# Altium footprint library CPU_STM.PcbLib: 216 footprints (part 8 of 15)
Each footprint in its own frame and in the unit in brackets; x right, y up, seen from the top. Pads: shape width x height; smd on the part's side, far side on the other; paste and mask are expansions set on the pad; w line width, h text height; cw(c..) or ccw(c..) is an arc to the next point about the centre after c.
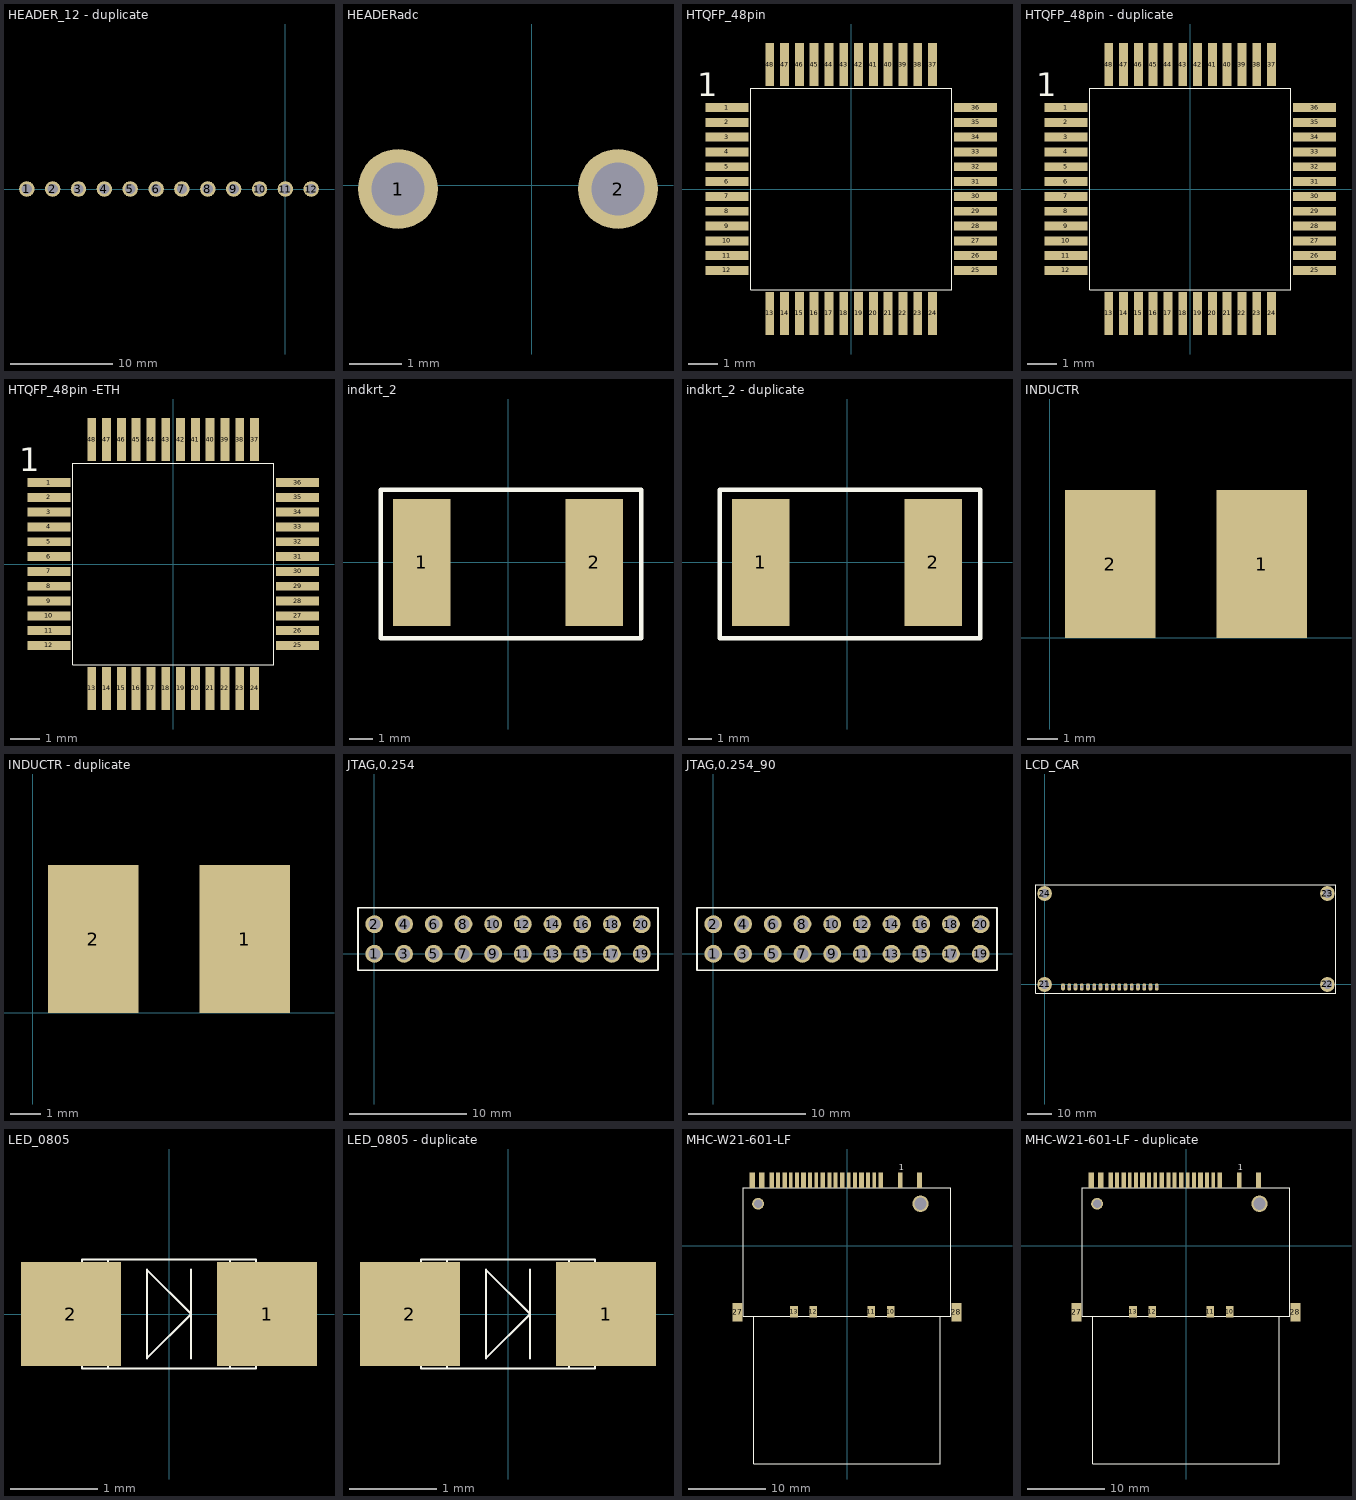
[diagram p7: the footprints below, top view; thin cyan lines are the x and y axes]

## HEADER_12 - duplicate [mil]
pads (12):
  round 60 hole 40: 1(-1000,0) 2(-900,0) 3(-800,0) 4(-700,0) 5(-600,0) 6(-500,0) 7(-400,0) 8(-300,0) 9(-200,0) 10(-100,0) 11(0,0) 12(100,0)

## HEADERadc [mil]
pads (2):
  round 60 hole 40: 1(-100.39,-2.95) 2(64.61,-2.95)

## HTQFP_48pin [mm] "HTQFP_48PIN"
pads (48):
  rect 1.45x0.3 smd mask+0.2: 1(-4.2,2.75) 2(-4.2,2.25) 3(-4.2,1.75) 4(-4.2,1.25) 5(-4.2,0.75) 6(-4.2,0.25) 7(-4.2,-0.25) 8(-4.2,-0.75) 9(-4.2,-1.25) 10(-4.2,-1.75) 11(-4.2,-2.25) 12(-4.2,-2.75) 25(4.2,-2.75) 26(4.2,-2.25) 27(4.2,-1.75) 28(4.2,-1.25) 29(4.2,-0.75) 30(4.2,-0.25) 31(4.2,0.25) 32(4.2,0.75) 33(4.2,1.25) 34(4.2,1.75) 35(4.2,2.25) 36(4.2,2.75)
  rect 0.3x1.45 smd mask+0.2: 13(-2.75,-4.2) 14(-2.25,-4.2) 15(-1.75,-4.2) 16(-1.25,-4.2) 17(-0.75,-4.2) 18(-0.25,-4.2) 19(0.25,-4.2) 20(0.75,-4.2) 21(1.25,-4.2) 22(1.75,-4.2) 23(2.25,-4.2) 24(2.75,-4.2) 37(2.75,4.2) 38(2.25,4.2) 39(1.75,4.2) 40(1.25,4.2) 41(0.75,4.2) 42(0.25,4.2) 43(-0.25,4.2) 44(-0.75,4.2) 45(-1.25,4.2) 46(-1.75,4.2) 47(-2.25,4.2) 48(-2.75,4.2)
Top Overlay:
  lines w0.025: -3.4,-3.4 3.4,-3.4 3.4,3.4 -3.4,3.4 -3.4,-3.4
  text "1" at -5.207,3.124 h0.79

## HTQFP_48pin - duplicate [mm] "HTQFP_48PIN"
pads (48):
  rect 1.45x0.3 smd mask+0.2: 1(-4.2,2.75) 2(-4.2,2.25) 3(-4.2,1.75) 4(-4.2,1.25) 5(-4.2,0.75) 6(-4.2,0.25) 7(-4.2,-0.25) 8(-4.2,-0.75) 9(-4.2,-1.25) 10(-4.2,-1.75) 11(-4.2,-2.25) 12(-4.2,-2.75) 25(4.2,-2.75) 26(4.2,-2.25) 27(4.2,-1.75) 28(4.2,-1.25) 29(4.2,-0.75) 30(4.2,-0.25) 31(4.2,0.25) 32(4.2,0.75) 33(4.2,1.25) 34(4.2,1.75) 35(4.2,2.25) 36(4.2,2.75)
  rect 0.3x1.45 smd mask+0.2: 13(-2.75,-4.2) 14(-2.25,-4.2) 15(-1.75,-4.2) 16(-1.25,-4.2) 17(-0.75,-4.2) 18(-0.25,-4.2) 19(0.25,-4.2) 20(0.75,-4.2) 21(1.25,-4.2) 22(1.75,-4.2) 23(2.25,-4.2) 24(2.75,-4.2) 37(2.75,4.2) 38(2.25,4.2) 39(1.75,4.2) 40(1.25,4.2) 41(0.75,4.2) 42(0.25,4.2) 43(-0.25,4.2) 44(-0.75,4.2) 45(-1.25,4.2) 46(-1.75,4.2) 47(-2.25,4.2) 48(-2.75,4.2)
Top Overlay:
  lines w0.025: -3.4,-3.4 3.4,-3.4 3.4,3.4 -3.4,3.4 -3.4,-3.4
  text "1" at -5.207,3.124 h0.79

## HTQFP_48pin -ETH [mm] "HTQFP_48PIN"
pads (48):
  rect 1.45x0.3 smd mask+0.2: 1(-4.2,2.75) 2(-4.2,2.25) 3(-4.2,1.75) 4(-4.2,1.25) 5(-4.2,0.75) 6(-4.2,0.25) 7(-4.2,-0.25) 8(-4.2,-0.75) 9(-4.2,-1.25) 10(-4.2,-1.75) 11(-4.2,-2.25) 12(-4.2,-2.75) 25(4.2,-2.75) 26(4.2,-2.25) 27(4.2,-1.75) 28(4.2,-1.25) 29(4.2,-0.75) 30(4.2,-0.25) 31(4.2,0.25) 32(4.2,0.75) 33(4.2,1.25) 34(4.2,1.75) 35(4.2,2.25) 36(4.2,2.75)
  rect 0.3x1.45 smd mask+0.2: 13(-2.75,-4.2) 14(-2.25,-4.2) 15(-1.75,-4.2) 16(-1.25,-4.2) 17(-0.75,-4.2) 18(-0.25,-4.2) 19(0.25,-4.2) 20(0.75,-4.2) 21(1.25,-4.2) 22(1.75,-4.2) 23(2.25,-4.2) 24(2.75,-4.2) 37(2.75,4.2) 38(2.25,4.2) 39(1.75,4.2) 40(1.25,4.2) 41(0.75,4.2) 42(0.25,4.2) 43(-0.25,4.2) 44(-0.75,4.2) 45(-1.25,4.2) 46(-1.75,4.2) 47(-2.25,4.2) 48(-2.75,4.2)
Top Overlay:
  lines w0.025: -3.4,-3.4 -3.4,3.4 3.4,3.4 3.4,-3.4 -3.4,-3.4
  text "1" at -5.207,3.124 h0.79
3D body "User Library-LQFP48-7x7-0_50.step": height 1.4, standoff -0.05, extent -4.5,-4.5 4.5,4.5

## indkrt_2 [mil]
pads (2):
  rect 95x210 smd: 1(-142.5,0) 2(142.5,0)
Top Overlay:
  lines w7.87: -210,-125 -210,-26.57 -210,120 220,120 220,-125 -210,-125

## indkrt_2 - duplicate [mil]
pads (2):
  rect 95x210 smd: 1(-142.5,0) 2(142.5,0)
Top Overlay:
  lines w7.87: -210,-125 220,-125 220,120 -210,120 -210,-26.57 -210,-125

## INDUCTR [mm]
pads (2):
  rect 3x4.9 smd: 1(7,2.44) 2(2,2.44)

## INDUCTR - duplicate [mm]
pads (2):
  rect 3x4.9 smd: 1(7,2.44) 2(2,2.44)

## JTAG,0.254 [mil]
pads (20):
  round 60 hole 40: 1(0,0) 2(0,100) 3(100,0) 4(100,100) 5(200,0) 6(200,100) 7(300,0) 8(300,100) 9(400,0) 10(400,100) 11(500,0) 12(500,100) 13(600,0) 14(600,100) 15(700,0) 16(700,100) 17(800,0) 18(800,100) 19(900,0) 20(900,100)
Top Overlay:
  lines w6: -55,-55 955,-55 955,155 -55,155 -55,-55
3D body "Header 2X10.STEP": height 322.18, standoff -110.89, extent -50,-50 950,150

## JTAG,0.254_90 [mil]
pads (20):
  round 60 hole 40: 1(0,0) 2(0,100) 3(100,0) 4(100,100) 5(200,0) 6(200,100) 7(300,0) 8(300,100) 9(400,0) 10(400,100) 11(500,0) 12(500,100) 13(600,0) 14(600,100) 15(700,0) 16(700,100) 17(800,0) 18(800,100) 19(900,0) 20(900,100)
Top Overlay:
  lines w6: -55,-55 -55,155 955,155 955,-55 -55,-55
3D body "header_90.stp": height 196.85, standoff -147.64, extent -51.18,-13.98 948.82,476.38

## LCD_CAR [mm]
pads (20):
  oval 1.524x3 hole 1.016: 1(40.5,-1) 2(37.96,-1) 3(35.42,-1) 4(32.88,-1) 5(30.34,-1) 6(27.8,-1) 7(25.26,-1) 8(22.72,-1) 9(20.18,-1) 10(17.64,-1) 11(15.1,-1) 12(12.56,-1) 13(10.02,-1) 14(7.48,-1) 15(43.04,-1) 16(45.58,-1)
  round 6 hole 3.6: 21(0,0) 22(115,0) 23(115,37) 24(0,37)
Top Overlay:
  lines w0.2: -3.5,-3.5 12.56,-3.5 118.5,-3.5 118.5,0 118.5,40.5 115,40.5 -3.5,40.5 -3.5,-1 -3.5,-3.5
3D body "RC1602E.step": height 31.6, standoff 18.5, extent -3.7,-3.65 118.8,40.85

## LED_0805 [mil]
pads (2):
  rect 45.28x47 smd: 1(44.29,0) 2(-44.29,0)
Top Overlay:
  lines w1: 10,-20 10,20 ; -39.37,-24.61 39.37,-24.61 39.37,24.61 -39.37,24.61 -39.37,-24.61 ; -27.56,-24.61 27.56,-24.61 27.56,24.61 -27.56,24.61 -27.56,-24.61 ; -10,-20 -10,20 10,0 -10,-20
3D body "User Library-LED SMD0805.step": height 33.45, standoff 0.23, extent -40.6,-15 40.6,20.68

## LED_0805 - duplicate [mil]
pads (2):
  rect 45.28x47 smd: 1(44.29,0) 2(-44.29,0)
Top Overlay:
  lines w1: 10,-20 10,20 ; -39.37,-24.61 -39.37,24.61 39.37,24.61 39.37,-24.61 -39.37,-24.61 ; -27.56,-24.61 -27.56,24.61 27.56,24.61 27.56,-24.61 -27.56,-24.61 ; -10,-20 10,0 -10,20 -10,-20

## MHC-W21-601-LF [mm] "MHC-W21-601-LF"
pads (30):
  rect 0.6x2 smd: 1(6.875,8.5) 2(4.375,8.5) 3(1.875,8.5) 4(-0.625,8.5) 5(-3.125,8.5) 6(-5.625,8.5) 7(-8.05,8.5) 8(-9.75,8.5) 9(9.375,8.5)
  rect 1x1.5 smd: 10(5.65,-8.5) 11(3.15,-8.5) 12(-4.35,-8.5) 13(-6.85,-8.5)
  rect 0.7x2 smd: 14(-12.25,8.5) 15(-11.05,8.5)
  rect 0.5x2 smd: 16(-7.27,8.5) 17(-6.475,8.5) 18(-4.775,8.5) 19(-1.475,8.5) 20(0.225,8.5) 21(1.025,8.5) 22(2.725,8.5) 23(3.525,8.5) 24(-8.9,8.5) 25(-3.975,8.5) 26(-2.275,8.5)
  rect 1.3x2.4 smd: 27(-14.15,-8.55) 28(14.15,-8.55)
  round 1.524 hole 1.092: " "(-11.5,5.45)
  round 2.108 hole 1.6: " "(9.5,5.45)
Top Overlay:
  lines w0.025: -13.4,-9.1 -13.4,7.5 13.4,7.5 13.4,-9.1 -13.4,-9.1 ; -12.05,-28.2 -12.05,-9.1 12.05,-9.1 12.05,-28.2 -12.05,-28.2
  text "1" at 6.706,9.804 h0.79
Multi-Layer:
  region: 2.35,-6.75 2.35,-3.75 6.45,-3.75 6.45,-6.75
  region: -7.65,-6.75 -7.65,-3.75 -3.55,-3.75 -3.55,-6.75

## MHC-W21-601-LF - duplicate [mm] "MHC-W21-601-LF"
pads (30):
  rect 0.6x2 smd: 1(6.875,8.5) 2(4.375,8.5) 3(1.875,8.5) 4(-0.625,8.5) 5(-3.125,8.5) 6(-5.625,8.5) 7(-8.05,8.5) 8(-9.75,8.5) 9(9.375,8.5)
  rect 1x1.5 smd: 10(5.65,-8.5) 11(3.15,-8.5) 12(-4.35,-8.5) 13(-6.85,-8.5)
  rect 0.7x2 smd: 14(-12.25,8.5) 15(-11.05,8.5)
  rect 0.5x2 smd: 16(-7.27,8.5) 17(-6.475,8.5) 18(-4.775,8.5) 19(-1.475,8.5) 20(0.225,8.5) 21(1.025,8.5) 22(2.725,8.5) 23(3.525,8.5) 24(-8.9,8.5) 25(-3.975,8.5) 26(-2.275,8.5)
  rect 1.3x2.4 smd: 27(-14.15,-8.55) 28(14.15,-8.55)
  round 1.524 hole 1.092: " "(-11.5,5.45)
  round 2.108 hole 1.6: " "(9.5,5.45)
Top Overlay:
  lines w0.025: -13.4,-9.1 -13.4,7.5 13.4,7.5 13.4,-9.1 -13.4,-9.1 ; -12.05,-28.2 -12.05,-9.1 12.05,-9.1 12.05,-28.2 -12.05,-28.2
  text "1" at 6.706,9.804 h0.79
Multi-Layer:
  region: 2.35,-6.75 2.35,-3.75 6.45,-3.75 6.45,-6.75
  region: -7.65,-6.75 -7.65,-3.75 -3.55,-3.75 -3.55,-6.75